# Altium footprint library TranDangKhoa-LIB.PcbLib: 1435 footprints (part 53 of 90)
Each footprint in its own frame and in the unit in brackets; x right, y up, seen from the top. Pads: shape width x height; smd on the part's side, far side on the other; paste and mask are expansions set on the pad; w line width, h text height; cw(c..) or ccw(c..) is an arc to the next point about the centre after c.
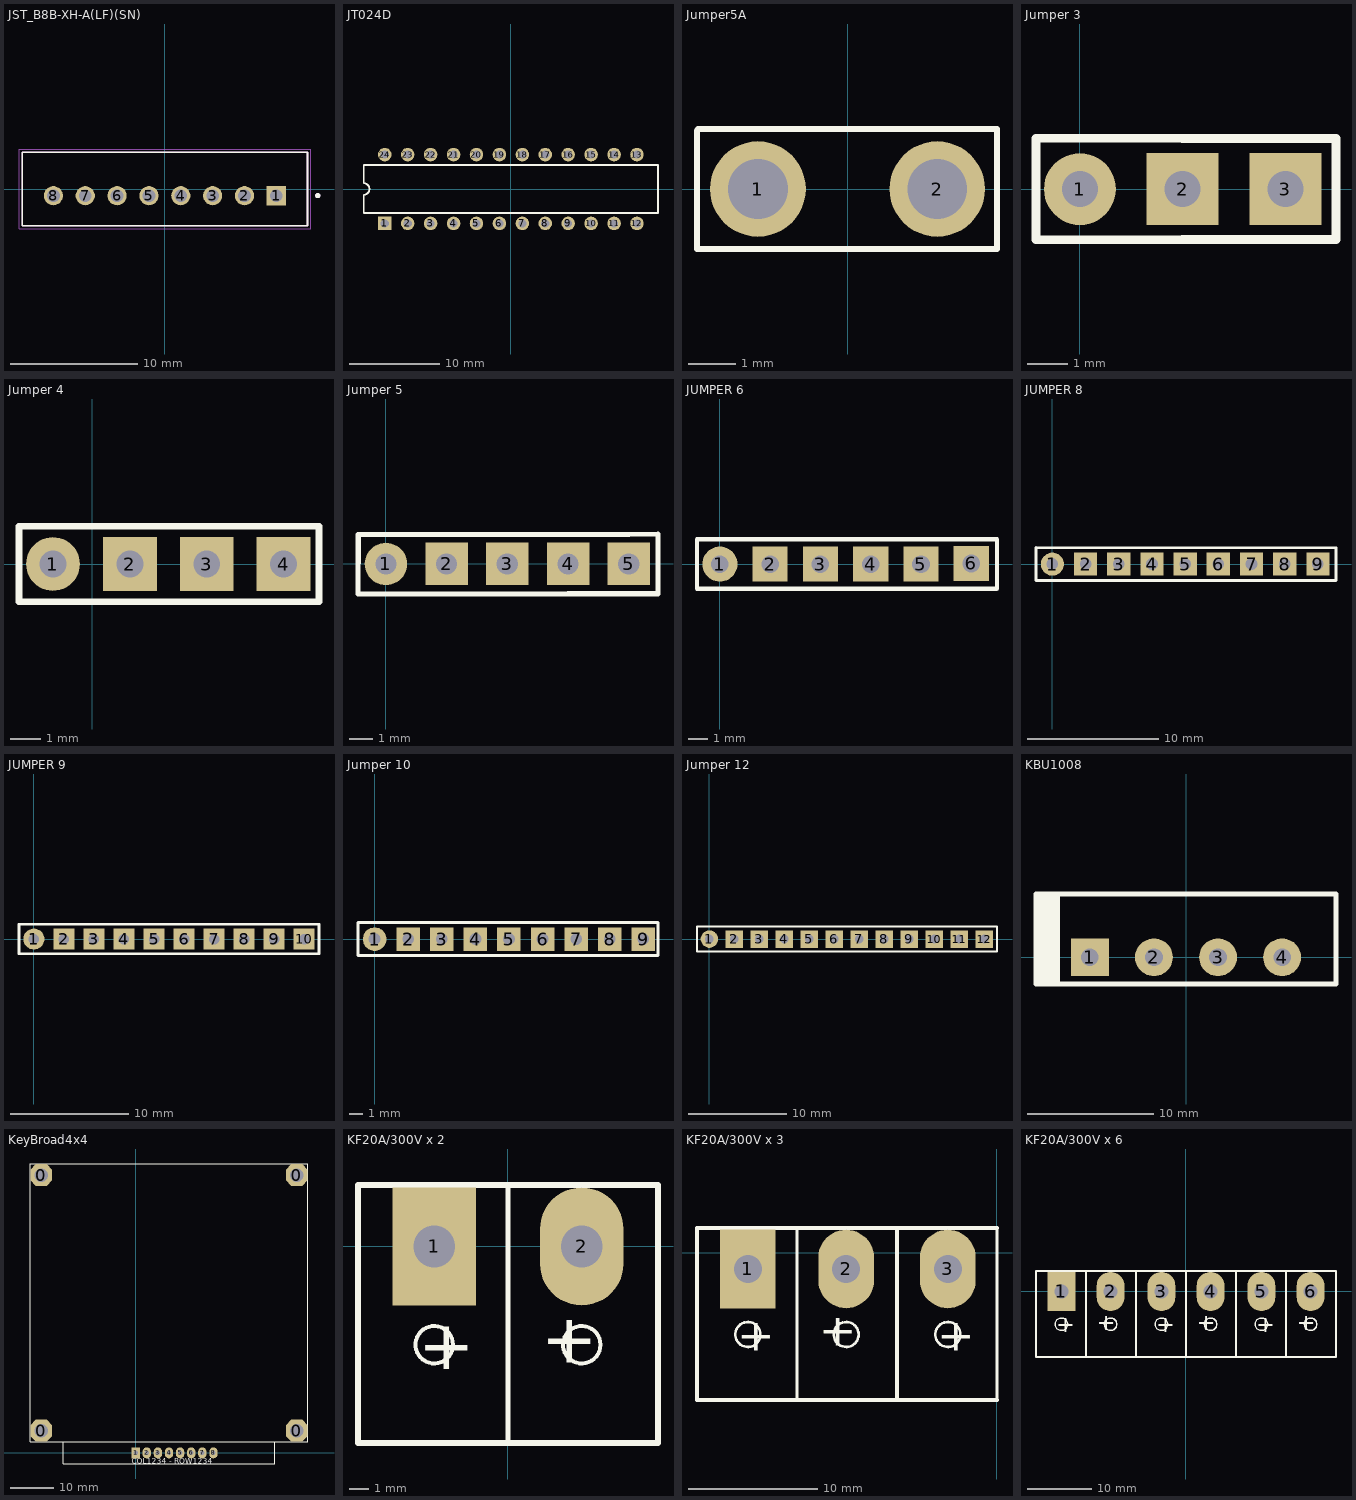
[diagram p52: the footprints below, top view; thin cyan lines are the x and y axes]

## JST_B8B-XH-A(LF)(SN) [mm]
height 7
pads (8):
  rect 1.508x1.508 / inner round 1.508 / far side rect 1.508x1.508 hole 1: 1(8.75,-0.525)
  round 1.508 hole 1: 2(6.25,-0.525) 3(3.75,-0.525) 4(1.25,-0.525) 5(-1.25,-0.525) 6(-3.75,-0.525) 7(-6.25,-0.525) 8(-8.75,-0.525)
Top Overlay:
  circle w0.2: c12,-0.525 r0.1
  lines w0.127: -11.2,-2.875 -11.2,2.875 11.2,2.875 11.2,-2.875 -11.2,-2.875
Mechanical 13:
  circle w0.2: c12,-0.525 r0.1
  lines w0.127: -11.2,-2.875 -11.2,2.875 11.2,2.875 11.2,-2.875 -11.2,-2.875
Mechanical 15:
  lines w0.05: -11.45,-3.125 -11.45,3.125 11.45,3.125 11.45,-3.125 -11.45,-3.125
3D body "step_temp.STEP": height 7, standoff -3.4, extent -11.2,-2.875 11.2,2.875

## JT024D [mm] "DIP; 24 Leads; Row Spacing 7.62 mm; Pitch 2.54 mm"
height 5.08
pads (24):
  rect 1.5x1.5 hole 0.9: 1(-13.97,-3.81)
  round 1.5 hole 0.9: 2(-11.43,-3.81) 3(-8.89,-3.81) 4(-6.35,-3.81) 5(-3.81,-3.81) 6(-1.27,-3.81) 7(1.27,-3.81) 8(3.81,-3.81) 9(6.35,-3.81) 10(8.89,-3.81) 11(11.43,-3.81) 12(13.97,-3.81) 13(13.97,3.81) 14(11.43,3.81) 15(8.89,3.81) 16(6.35,3.81) 17(3.81,3.81) 18(1.27,3.81) 19(-1.27,3.81) 20(-3.81,3.81) 21(-6.35,3.81) 22(-8.89,3.81) 23(-11.43,3.81) 24(-13.97,3.81)
Top Overlay:
  lines w0.2: -16.3,-2.65 -16.3,-0.635 ccw(c-16.3,0) -16.3,0.635 -16.3,2.65 16.3,2.65 16.3,-2.65 -16.3,-2.65

## Jumper5A [mil] "JacPower"
pads (2):
  round 80 hole 50: 1(-75,0) 2(75,0)
Top Overlay:
  lines w5: -125.98,-50 -75,-50 125,-50 125,50 -125,50 -125.98,49.02 -125.98,-50

## Jumper 3 [mil]
pads (3):
  round 70 hole 35 unplated: 1(0,0)
  rect 70x70 hole 35 unplated: 2(100,0) 3(200,0)
Top Overlay:
  lines w8.66: -42.75,-49.25 -42.75,49.5 100,49.21 200,49.21 249.21,49.21 249.21,-49.21 200,-49.21 100,-49.21 -42.75,-49.25

## Jumper 4 [mil]
pads (4):
  round 70 hole 35 unplated: 1(-51,0)
  rect 70x70 hole 35 unplated: 2(49,0) 3(149,0) 4(249,0)
Top Overlay:
  lines w8.66: -95.16,-48.96 -95.16,49.21 295,49.21 295,-49.21 -94.91,-49.21

## Jumper 5 [mil]
pads (5):
  round 70 hole 35 unplated: 1(0,0)
  rect 70x70 hole 35 unplated: 2(100,0) 3(200,0) 4(300,0) 5(400,0)
Top Overlay:
  lines w8.66: -46,-49.25 300,-49.21 400,-49.21 448.21,-49.21 448.21,49.21 400,48.46 300,48.46 -45.5,48.75 -46,-49.25

## JUMPER 6 [mil]
pads (6):
  round 70 hole 35 unplated: 1(0,0)
  rect 70x70 hole 35 unplated: 2(100,0) 3(200,0) 4(300,0) 5(400,0) 6(500,1.25)
Top Overlay:
  lines w8.66: -45.5,-48.75 550.75,-48.75 551.21,-48.29 551.21,49.21 -45.5,49.21 -45.5,-48.75

## JUMPER 8 [mil]
pads (9):
  round 70 hole 35 unplated: 1(0,0)
  rect 70x70 hole 35 unplated: 2(100,0) 3(200,0) 4(300,0) 5(400,0) 6(500,0) 7(600,0) 8(700,0) 9(800,0)
Top Overlay:
  lines w8.66: -49.5,-49.25 800,-49.21 854.5,-49.21 854.5,49.21 800,49.21 -49.5,49.5 -49.5,-49.25

## JUMPER 9 [mil]
pads (10):
  round 70 hole 35 unplated: 1(0,0)
  rect 70x70 hole 35 unplated: 2(100,0) 3(200,0) 4(300,0) 5(400,0) 6(500,0) 7(600,0) 8(700,0) 9(800,0) 10(900,0)
Top Overlay:
  lines w8.66: -49.5,-49.25 800,-49.21 900,-49.21 949.21,-49.21 949.21,49.21 900,49.21 800,49.21 -49.5,49.5 -49.5,-49.25

## Jumper 10 [mil]
pads (9):
  round 70 hole 35 unplated: 1(0,0)
  rect 70x70 hole 35 unplated: 2(100,0) 3(200,0) 4(300,0) 5(400,0) 6(500,0) 7(600,0) 8(700,0) 9(800,0)
Top Overlay:
  lines w8.66: 843.5,-49.25 -49.5,-49.25 -49.5,49.5 843.75,50 ; 843.71,-49.21 843.71,49.21

## Jumper 12 [mil]
pads (12):
  round 70 hole 35 unplated: 1(0,0)
  rect 70x70 hole 35 unplated: 2(100,0) 3(200,0) 4(300,0) 5(400,0) 6(500,0) 7(600,0) 8(700,0) 9(800,0) 10(900,0) 11(1000,0) 12(1100,0)
Top Overlay:
  lines w8.66: -49.5,-49.25 -49.5,49.5 1151.5,50.17 1151.5,-49.25 -49.5,-49.25

## KBU1008 [mm] "Diode bridge"
height 7.62
pads (4):
  rect 3x3 hole 1.4: 1(-7.62,0)
  round 3 hole 1.4: 2(-2.54,0) 3(2.54,0) 4(7.62,0)
Top Overlay:
  rectangle: -11.887,-2.108 -10.16,5.004
  lines w0.381: -10.16,-2.108 -10.16,5.004 ; -11.887,-2.108 11.887,-2.108 11.887,5.004 -11.887,5.004 -11.887,-2.108

## KeyBroad4x4 [mm] "KeyBroad 4x4"
height 5.08
pads (12):
  oct 5x5 hole 3.048: 0(-21.59,5.08) 0(-21.59,63.5) 0(36.83,5.08) 0(36.83,63.5)
  rect 1.905x2.5 hole 1: 1(0,0)
  oval 1.905x2.5 hole 1: 2(2.54,0) 3(5.08,0) 4(7.62,0) 5(10.16,0) 6(12.7,0) 7(15.24,0) 8(17.78,0)
Top Overlay:
  lines w0.203: -16.51,2.54 -16.51,-2.515 -16.535,-2.54 31.75,-2.54 31.75,2.489 ; -24.13,2.54 -24.13,66.04 39.37,66.04 39.37,2.54 -24.13,2.54
  text "COL1234 - ROW1234" at -0.889,-2.464 h1.27

## KF20A/300V x 2 [mil] "Jac nguon 220V 20A XANH"
pads (2):
  rect 170x240 hole 85: 1(-150,0)
  oval 170x240 hole 85: 2(150,0)
Top Overlay:
  circle w8: c150,-200 r38.08
  circle w8: c-150,-200 r38.08
  lines w10: 0,-400 0,125
  lines w11.81: 305.12,-400 -305.12,-400 -305.12,125 305.12,125 ; 305.12,-400 305.12,125 ; 305.12,-400 305.12,125
  text "+" at 183,-150 h100
  text "+" at -183,-250 h100

## KF20A/300V x 3 [mil] "Jac nguon 220V 20A XANH"
height 500
pads (3):
  rect 170x240 hole 85: 1(-760.24,-50)
  oval 170x240 hole 85: 2(-460.24,-50) 3(-150,-50)
Top Overlay:
  circle w8: c-150,-250 r38.08
  circle w8: c-760.24,-250 r38.08
  circle w8: c-460.24,-250 r38.08
  lines w10: -610.24,-450 -610.24,75 ; 0,-450 0,75
  lines w11.81: 0,-450 -305.12,-450 ; 0,75 -915.35,75 -915.35,-450 -305.12,-450 ; -305.12,-450 -305.12,75 -305.12,-450
  text "+" at -183,-300 h100
  text "+" at -793.24,-300 h100
  text "+" at -427.24,-200 h100

## KF20A/300V x 6 [mil] "Jac nguon 220V 20A XANH"
height 216.54
pads (6):
  rect 170x240 hole 85: 1(-760.24,0)
  oval 170x240 hole 85: 2(-460.24,0) 3(-150,0) 4(150,0) 5(460.24,0) 6(760.24,0)
Top Overlay:
  circle w8: c-460.24,-200 r38.08
  circle w8: c-760.24,-200 r38.08
  circle w8: c-150,-200 r38.08
  circle w8: c150,-200 r38.08
  circle w8: c760.24,-200 r38.08
  circle w8: c460.24,-200 r38.08
  lines w10: -610.24,-400 -610.24,125 ; 0,-400 0,125 ; 610.24,-400 610.24,125
  lines w11.81: -305.12,-400 -915.35,-400 -915.35,125 -305.12,125 ; -305.12,-400 -305.12,125 ; -305.12,-400 -305.12,125 ; -305.12,-400 305.12,-400 ; -305.12,125 305.12,125 ; 305.12,-400 305.12,125 ; 305.12,-400 915.35,-400 ; 305.12,-400 305.12,125 ; 305.12,125 915.35,125 ; 915.35,-400 915.35,125 ; 915.35,-400 915.35,125
  text "+" at -427.24,-150 h100
  text "+" at -793.24,-250 h100
  text "+" at -183,-250 h100
  text "+" at 183,-150 h100
  text "+" at 793.24,-150 h100
  text "+" at 427.24,-250 h100